# Altium footprint library CUSTOM PCB.PcbLib: 404 footprints (part 15 of 26)
Each footprint in its own frame and in the unit in brackets; x right, y up, seen from the top. Pads: shape width x height; smd on the part's side, far side on the other; paste and mask are expansions set on the pad; w line width, h text height; cw(c..) or ccw(c..) is an arc to the next point about the centre after c.
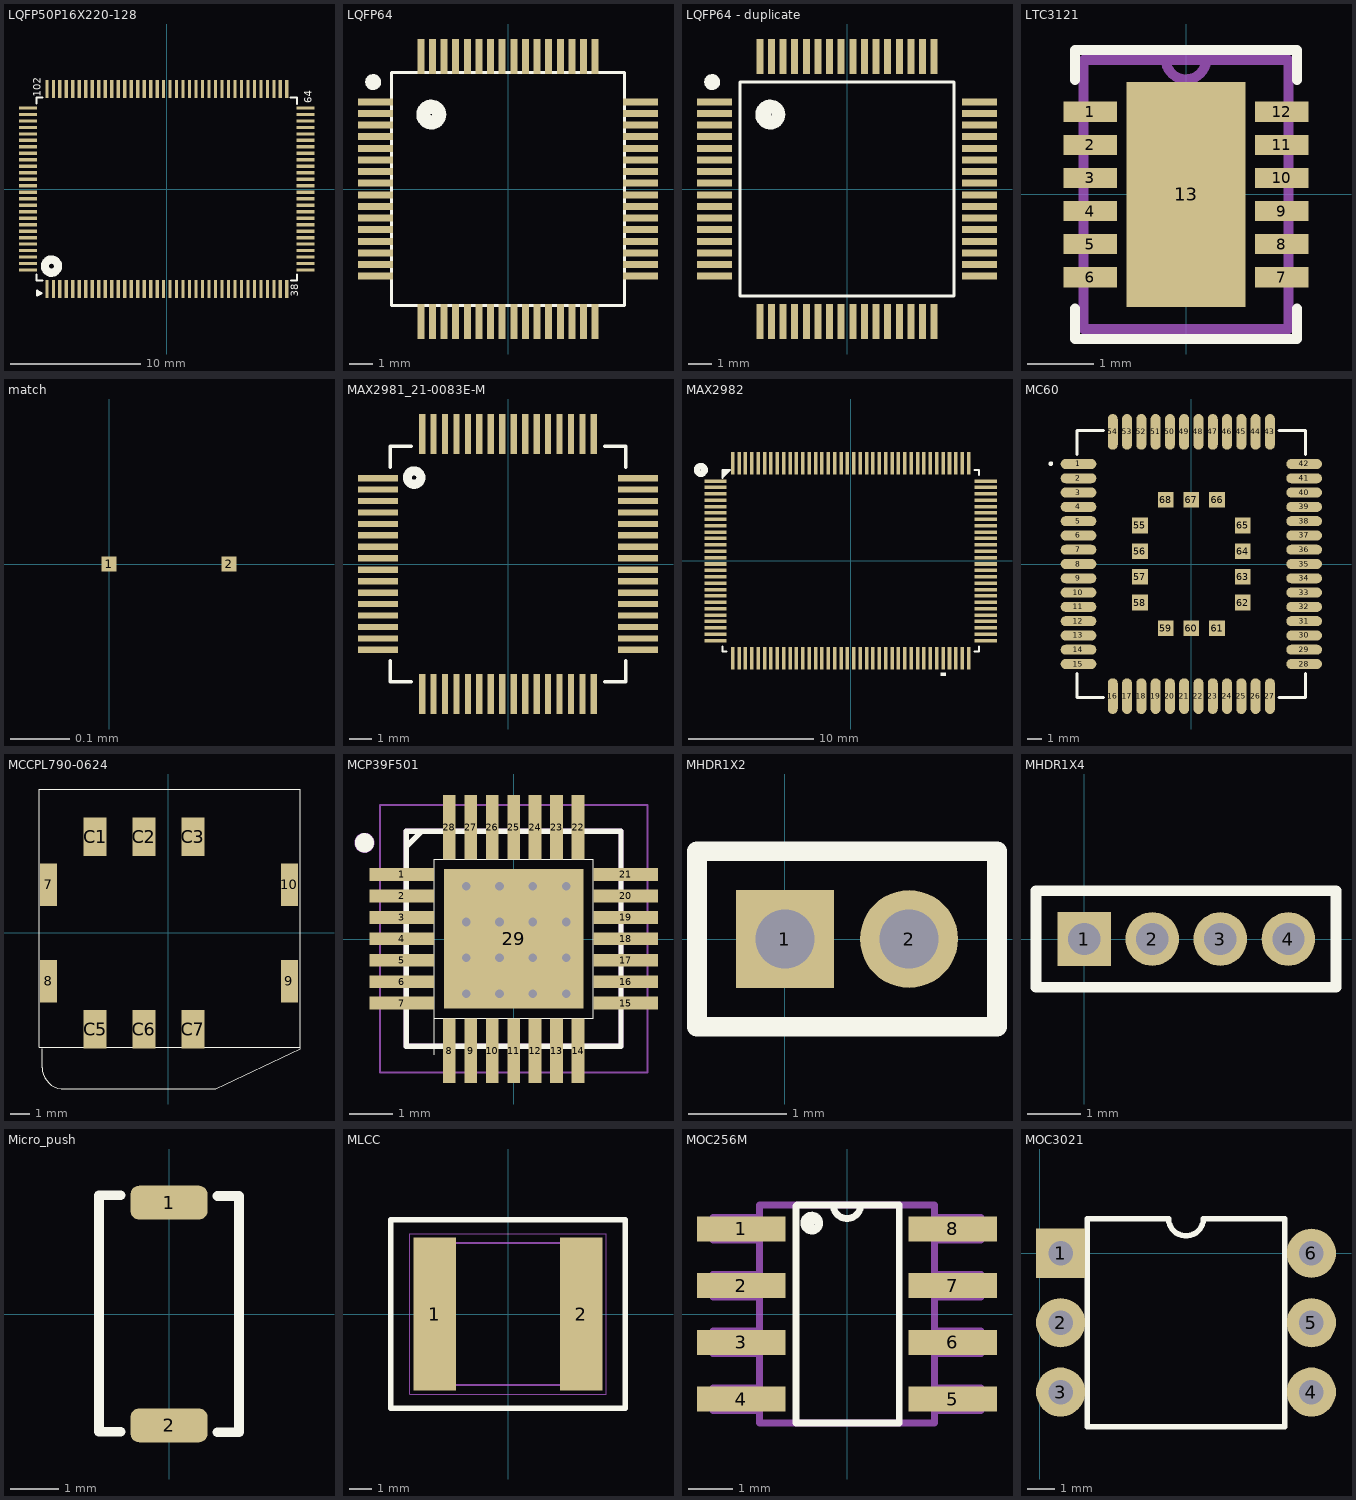
[diagram p14: the footprints below, top view; thin cyan lines are the x and y axes]

## LQFP50P16X220-128 [mm]
pads (128):
  rect 0.25x1.4 smd: 1(-9.25,-7.7) 2(-8.75,-7.7) 3(-8.25,-7.7) 4(-7.75,-7.7) 5(-7.25,-7.7) 6(-6.75,-7.7) 7(-6.25,-7.7) 8(-5.75,-7.7) 9(-5.25,-7.7) 10(-4.75,-7.7) 11(-4.25,-7.7) 12(-3.75,-7.7) 13(-3.25,-7.7) 14(-2.75,-7.7) 15(-2.25,-7.7) 16(-1.75,-7.7) 17(-1.25,-7.7) 18(-0.75,-7.7) 19(-0.25,-7.7) 20(0.25,-7.7) 21(0.75,-7.7) 22(1.25,-7.7) 23(1.75,-7.7) 24(2.25,-7.7) 25(2.75,-7.7) 26(3.25,-7.7) 27(3.75,-7.7) 28(4.25,-7.7) 29(4.75,-7.7) 30(5.25,-7.7) 31(5.75,-7.7) 32(6.25,-7.7) 33(6.75,-7.7) 34(7.25,-7.7) 35(7.75,-7.7) 36(8.25,-7.7) 37(8.75,-7.7) 38(9.25,-7.7) 65(9.25,7.7) 66(8.75,7.7) 67(8.25,7.7) 68(7.75,7.7) 69(7.25,7.7) 70(6.75,7.7) 71(6.25,7.7) 72(5.75,7.7) 73(5.25,7.7) 74(4.75,7.7) 75(4.25,7.7) 76(3.75,7.7) 77(3.25,7.7) 78(2.75,7.7) 79(2.25,7.7) 80(1.75,7.7) 81(1.25,7.7) 82(0.75,7.7) 83(0.25,7.7) 84(-0.25,7.7) 85(-0.75,7.7) 86(-1.25,7.7) 87(-1.75,7.7) 88(-2.25,7.7) 89(-2.75,7.7) 90(-3.25,7.7) 91(-3.75,7.7) 92(-4.25,7.7) 93(-4.75,7.7) 94(-5.25,7.7) 95(-5.75,7.7) 96(-6.25,7.7) 97(-6.75,7.7) 98(-7.25,7.7) 99(-7.75,7.7) 100(-8.25,7.7) 101(-8.75,7.7) 102(-9.25,7.7)
  rect 1.4x0.25 smd: 39(10.7,-6.25) 40(10.7,-5.75) 41(10.7,-5.25) 42(10.7,-4.75) 43(10.7,-4.25) 44(10.7,-3.75) 45(10.7,-3.25) 46(10.7,-2.75) 47(10.7,-2.25) 48(10.7,-1.75) 49(10.7,-1.25) 50(10.7,-0.75) 51(10.7,-0.25) 52(10.7,0.25) 53(10.7,0.75) 54(10.7,1.25) 55(10.7,1.75) 56(10.7,2.25) 57(10.7,2.75) 58(10.7,3.25) 59(10.7,3.75) 60(10.7,4.25) 61(10.7,4.75) 62(10.7,5.25) 63(10.7,5.75) 64(10.7,6.25) 103(-10.7,6.25) 104(-10.7,5.75) 105(-10.7,5.25) 106(-10.7,4.75) 107(-10.7,4.25) 108(-10.7,3.75) 109(-10.7,3.25) 110(-10.7,2.75) 111(-10.7,2.25) 112(-10.7,1.75) 113(-10.7,1.25) 114(-10.7,0.75) 115(-10.7,0.25) 116(-10.7,-0.25) 117(-10.7,-0.75) 118(-10.7,-1.25) 119(-10.7,-1.75) 120(-10.7,-2.25) 121(-10.7,-2.75) 122(-10.7,-3.25) 123(-10.7,-3.75) 124(-10.7,-4.25) 125(-10.7,-4.75) 126(-10.7,-5.25) 127(-10.7,-5.75) 128(-10.7,-6.25)
Top Overlay:
  circle w0.635: c-8.898,-5.944 r0.508
  lines w0.15: -10.05,-6.575 -10.05,-7.05 -9.6,-7.05 ; -10.05,6.575 -10.05,7.05 -9.6,7.05 ; 9.525,7.05 10.05,7.05 10.05,6.55 ; 9.575,-7.05 10.05,-7.05 10.05,-6.6
  lines w0.2: -9.996,-8.175 -9.996,-7.861 -9.686,-8.038 -9.983,-8.182
  text "38" at 10.132,-8.29 h0.55
  text "64" at 11.179,6.614 h0.55
  text "102" at -9.737,7.108 h0.55
3D body "User Library-LQFP-144-1.x_t": height 1.5, standoff -0.05, extent -10.981,-8.005 11.234,8.208

## LQFP64 [mm]
pads (64):
  rect 1.5x0.3 smd: 1(-5.7,3.75) 2(-5.7,3.25) 3(-5.7,2.75) 4(-5.7,2.25) 5(-5.7,1.75) 6(-5.7,1.25) 7(-5.7,0.75) 8(-5.7,0.25) 9(-5.7,-0.25) 10(-5.7,-0.75) 11(-5.7,-1.25) 12(-5.7,-1.75) 13(-5.7,-2.25) 14(-5.7,-2.75) 15(-5.7,-3.25) 16(-5.7,-3.75) 33(5.7,-3.75) 34(5.7,-3.25) 35(5.7,-2.75) 36(5.7,-2.25) 37(5.7,-1.75) 38(5.7,-1.25) 39(5.7,-0.75) 40(5.7,-0.25) 41(5.7,0.25) 42(5.7,0.75) 43(5.7,1.25) 44(5.7,1.75) 45(5.7,2.25) 46(5.7,2.75) 47(5.7,3.25) 48(5.7,3.75)
  rect 0.3x1.5 smd: 17(-3.75,-5.7) 18(-3.25,-5.7) 19(-2.75,-5.7) 20(-2.25,-5.7) 21(-1.75,-5.7) 22(-1.25,-5.7) 23(-0.75,-5.7) 24(-0.25,-5.7) 25(0.25,-5.7) 26(0.75,-5.7) 27(1.25,-5.7) 28(1.75,-5.7) 29(2.25,-5.7) 30(2.75,-5.7) 31(3.25,-5.7) 32(3.75,-5.7) 49(3.75,5.7) 50(3.25,5.7) 51(2.75,5.7) 52(2.25,5.7) 53(1.75,5.7) 54(1.25,5.7) 55(0.75,5.7) 56(0.25,5.7) 57(-0.25,5.7) 58(-0.75,5.7) 59(-1.25,5.7) 60(-1.75,5.7) 61(-2.25,5.7) 62(-2.75,5.7) 63(-3.25,5.7) 64(-3.75,5.7)
Top Overlay:
  circle w0.127: c-3.3,3.2 r0.583
  circle w0.127: c-3.3,3.2 r0.566
  circle w0.127: c-3.3,3.2 r0.5
  circle w0.127: c-3.3,3.2 r0.424
  circle w0.127: c-3.3,3.2 r0.283
  circle w0.127: c-3.3,3.2 r0.361
  circle w0.127: c-3.3,3.2 r0.141
  circle w0.127: c-3.3,3.2 r0.224
  circle w0.127: c-3.3,3.2 r0.1
  circle w0.127: c-5.8,4.6 r0.283
  circle w0.127: c-5.8,4.6 r0.224
  circle w0.127: c-5.8,4.6 r0.141
  circle w0.127: c-5.8,4.6 r0.1
  circle w0.127: c-5.8,4.6 r0.141
  circle w0.127: c-5.9,4.6 r0.1
  lines w0.127: -5,-5 5,-5 5,5 -5,5 -5,-5
3D body "STM32F446RET6--3DModel-STEP-56544.STEP": height 1.63, standoff 0.03, extent -6,-6 6,6

## LQFP64 - duplicate [mm]
pads (64):
  rect 1.5x0.3 smd: 1(-5.7,3.75) 2(-5.7,3.25) 3(-5.7,2.75) 4(-5.7,2.25) 5(-5.7,1.75) 6(-5.7,1.25) 7(-5.7,0.75) 8(-5.7,0.25) 9(-5.7,-0.25) 10(-5.7,-0.75) 11(-5.7,-1.25) 12(-5.7,-1.75) 13(-5.7,-2.25) 14(-5.7,-2.75) 15(-5.7,-3.25) 16(-5.7,-3.75) 33(5.7,-3.75) 34(5.7,-3.25) 35(5.7,-2.75) 36(5.7,-2.25) 37(5.7,-1.75) 38(5.7,-1.25) 39(5.7,-0.75) 40(5.7,-0.25) 41(5.7,0.25) 42(5.7,0.75) 43(5.7,1.25) 44(5.7,1.75) 45(5.7,2.25) 46(5.7,2.75) 47(5.7,3.25) 48(5.7,3.75)
  rect 0.3x1.5 smd: 17(-3.75,-5.7) 18(-3.25,-5.7) 19(-2.75,-5.7) 20(-2.25,-5.7) 21(-1.75,-5.7) 22(-1.25,-5.7) 23(-0.75,-5.7) 24(-0.25,-5.7) 25(0.25,-5.7) 26(0.75,-5.7) 27(1.25,-5.7) 28(1.75,-5.7) 29(2.25,-5.7) 30(2.75,-5.7) 31(3.25,-5.7) 32(3.75,-5.7) 49(3.75,5.7) 50(3.25,5.7) 51(2.75,5.7) 52(2.25,5.7) 53(1.75,5.7) 54(1.25,5.7) 55(0.75,5.7) 56(0.25,5.7) 57(-0.25,5.7) 58(-0.75,5.7) 59(-1.25,5.7) 60(-1.75,5.7) 61(-2.25,5.7) 62(-2.75,5.7) 63(-3.25,5.7) 64(-3.75,5.7)
Top Overlay:
  circle w0.127: c-5.9,4.6 r0.1
  circle w0.127: c-5.8,4.6 r0.141
  circle w0.127: c-5.8,4.6 r0.1
  circle w0.127: c-5.8,4.6 r0.141
  circle w0.127: c-5.8,4.6 r0.224
  circle w0.127: c-5.8,4.6 r0.283
  circle w0.127: c-3.4,3.2 r0.1
  circle w0.127: c-3.3,3.2 r0.224
  circle w0.127: c-3.3,3.2 r0.141
  circle w0.127: c-3.3,3.2 r0.361
  circle w0.127: c-3.3,3.2 r0.283
  circle w0.127: c-3.3,3.2 r0.424
  circle w0.127: c-3.3,3.2 r0.5
  circle w0.127: c-3.3,3.2 r0.566
  circle w0.127: c-3.3,3.2 r0.583
  lines w0.127: -4.6,-4.6 -4.6,4.6 4.6,4.6 4.6,-4.6 -4.6,-4.6
3D body "STM32F446RET6--3DModel-STEP-56544.STEP": height 1.63, standoff 0.03, extent -6,-6 6,6

## LTC3121 [mil]
pads (13):
  rect 32x12 smd: 1(-57,49.21) 2(-57,29.53) 3(-57,9.84) 4(-57,-9.84) 5(-57,-29.53) 6(-57,-49.21) 7(57,-49.21) 8(57,-29.53) 9(57,-9.84) 10(57,9.84) 11(57,29.53) 12(57,49.21)
  rect 71x134 smd: 13(0,0)
Top Overlay:
  lines w6: -66,-68 -66,-86 66,-86 66,-68 ; -66,68 -66,86 66,86 66,68
Top Paste:
  region: -31.56,63.06 -31.56,3.94 31.56,3.94 31.56,63.06
  region: -31.56,-3.94 -31.56,-63.06 31.56,-63.06 31.56,-3.94
Mechanical 4:
  lines w6: -61,-80 61,-80 ; -61,-80 -61,80 ; -61,-80 61,-80 ; -61,-80 -61,80 ; -61,80 -12,80 ; -61,80 -12,80 ; -12,80 61,80 ; -12,80 61,80 ; 61,-80 61,80 ; 61,-80 61,80 ; -12,80.08 ccw(c0,80.5) 12,80.92 cw(c0,80.5) -12,80.08

## match [mil]
pads (2):
  rect 1x1 smd: 1(0,0) 2(8,0)

## MAX2981_21-0083E-M [mil]
pads (64):
  rect 70x11 smd paste+0 mask+0: 1(-227,150) 2(-227,130) 3(-227,110) 4(-227,90) 5(-227,70) 6(-227,50) 7(-227,30) 8(-227,10) 9(-227,-10) 10(-227,-30) 11(-227,-50) 12(-227,-70) 13(-227,-90) 14(-227,-110) 15(-227,-130) 16(-227,-150) 33(227,-150) 34(227,-130) 35(227,-110) 36(227,-90) 37(227,-70) 38(227,-50) 39(227,-30) 40(227,-10) 41(227,10) 42(227,30) 43(227,50) 44(227,70) 45(227,90) 46(227,110) 47(227,130) 48(227,150)
  rect 11x70 smd paste+0 mask+0: 17(-150,-227) 18(-130,-227) 19(-110,-227) 20(-90,-227) 21(-70,-227) 22(-50,-227) 23(-30,-227) 24(-10,-227) 25(10,-227) 26(30,-227) 27(50,-227) 28(70,-227) 29(90,-227) 30(110,-227) 31(130,-227) 32(150,-227) 49(150,227) 50(130,227) 51(110,227) 52(90,227) 53(70,227) 54(50,227) 55(30,227) 56(10,227) 57(-10,227) 58(-30,227) 59(-50,227) 60(-70,227) 61(-90,227) 62(-110,227) 63(-130,227) 64(-150,227)
Top Overlay:
  circle w15.75: c-164,151 r11.81
  lines w6: -206,-168.6 -206,-206 -168.6,-206 ; -206,168.6 -206,206 -168.6,206 ; 168.6,-206 206,-206 206,-168.6 ; 168.6,206 206,206 206,168.6
3D body "21-0083E-M.step": height 63.11, standoff 0, extent -240,-240 240,240

## MAX2982 [mil]
pads (128):
  rect 70x11 smd paste+0 mask+0: 1(-424,250) 2(-424,230) 3(-424,210) 4(-424,190) 5(-424,170) 6(-424,150) 7(-424,130) 8(-424,110) 9(-424,90) 10(-424,70) 11(-424,50) 12(-424,30) 13(-424,10) 14(-424,-10) 15(-424,-30) 16(-424,-50) 17(-424,-70) 18(-424,-90) 19(-424,-110) 20(-424,-130) 21(-424,-150) 22(-424,-170) 23(-424,-190) 24(-424,-210) 25(-424,-230) 26(-424,-250) 65(424,-250) 66(424,-230) 67(424,-210) 68(424,-190) 69(424,-170) 70(424,-150) 71(424,-130) 72(424,-110) 73(424,-90) 74(424,-70) 75(424,-50) 76(424,-30) 77(424,-10) 78(424,10) 79(424,30) 80(424,50) 81(424,70) 82(424,90) 83(424,110) 84(424,130) 85(424,150) 86(424,170) 87(424,190) 88(424,210) 89(424,230) 90(424,250)
  rect 11x70 smd paste+0 mask+0: 27(-370,-306) 28(-350,-306) 29(-330,-306) 30(-310,-306) 31(-290,-306) 32(-270,-306) 33(-250,-306) 34(-230,-306) 35(-210,-306) 36(-190,-306) 37(-170,-306) 38(-150,-306) 39(-130,-306) 40(-110,-306) 41(-90,-306) 42(-70,-306) 43(-50,-306) 44(-30,-306) 45(-10,-306) 46(10,-306) 47(30,-306) 48(50,-306) 49(70,-306) 50(90,-306) 51(110,-306) 52(130,-306) 53(150,-306) 54(170,-306) 55(190,-306) 56(210,-306) 57(230,-306) 58(250,-306) 59(270,-306) 60(290,-306) 61(310,-306) 62(330,-306) 63(350,-306) 64(370,-306) 91(370,306) 92(350,306) 93(330,306) 94(310,306) 95(290,306) 96(270,306) 97(250,306) 98(230,306) 99(210,306) 100(190,306) 101(170,306) 102(150,306) 103(130,306) 104(110,306) 105(90,306) 106(70,306) 107(50,306) 108(30,306) 109(10,306) 110(-10,306) 111(-30,306) 112(-50,306) 113(-70,306) 114(-90,306) 115(-110,306) 116(-130,306) 117(-150,306) 118(-170,306) 119(-190,306) 120(-210,306) 121(-230,306) 122(-250,306) 123(-270,306) 124(-290,306) 125(-310,306) 126(-330,306) 127(-350,306) 128(-370,306)
Top Overlay:
  circle w20: c-470,285 r12
  region: 297.5,-351 282.5,-351 282.5,-361 297.5,-361
  lines w6: -402.5,-268.6 -402.5,-284.5 -388.6,-284.5 ; -402,273 -379,284.5 ; -393,276.74 -402.5,284.5 ; 388.6,-284.5 402.5,-284.5 402.5,-268.6 ; 388.6,284.5 402.5,284.5 402.5,268.6 ; -402.5,260 -388.6,284.5 ; -402.5,260 -379,284.5 ; -402.5,260 -402.5,284.5 ; -402.5,284.5 -388.6,284.5 ; -402.5,284.5 -388.6,284.5 ; -388.6,284.5 -379,284.5
3D body: height 10, standoff 0, extent 0,0 10,10
3D body "21-0086D.step": height 63.11, standoff 0, extent -437.01,-319.01 437.01,319.01

## MC60 [mm]
pads (68):
  oval 2.5x0.7 smd: 1(-7.9,7) 2(-7.9,6) 3(-7.9,5) 4(-7.9,4) 5(-7.9,3) 6(-7.9,2) 7(-7.9,1) 8(-7.9,0) 9(-7.9,-1) 10(-7.9,-2) 11(-7.9,-3) 12(-7.9,-4) 13(-7.9,-5) 14(-7.9,-6) 15(-7.9,-7) 28(7.9,-7) 29(7.9,-6) 30(7.9,-5) 31(7.9,-4) 32(7.9,-3) 33(7.9,-2) 34(7.9,-1) 35(7.9,0) 36(7.9,1) 37(7.9,2) 38(7.9,3) 39(7.9,4) 40(7.9,5) 41(7.9,6) 42(7.9,7)
  oval 0.7x2.5 smd: 16(-5.5,-9.25) 17(-4.5,-9.25) 18(-3.5,-9.25) 19(-2.5,-9.25) 20(-1.5,-9.25) 21(-0.5,-9.25) 22(0.5,-9.25) 23(1.5,-9.25) 24(2.5,-9.25) 25(3.5,-9.25) 26(4.5,-9.25) 27(5.5,-9.25) 43(5.5,9.25) 44(4.5,9.25) 45(3.5,9.25) 46(2.5,9.25) 47(1.5,9.25) 48(0.5,9.25) 49(-0.5,9.25) 50(-1.5,9.25) 51(-2.5,9.25) 52(-3.5,9.25) 53(-4.5,9.25) 54(-5.5,9.25)
  rect 1.1x1.1 smd: 55(-3.6,2.7) 56(-3.6,0.9) 57(-3.6,-0.9) 58(-3.6,-2.7) 59(-1.8,-4.5) 60(0,-4.5) 61(1.8,-4.5) 62(3.6,-2.7) 63(3.6,-0.9) 64(3.6,0.9) 65(3.6,2.7) 66(1.8,4.5) 67(0,4.5) 68(-1.8,4.5)
Top Overlay:
  circle w0.2: c-9.835,7.021 r0.062
  lines w0.2: -8,-7.658 -8,-9.35 -6.143,-9.35 ; -8,7.658 -8,9.35 -6.143,9.35 ; 6.143,-9.35 8,-9.35 8,-7.658 ; 6.143,9.35 8,9.35 8,7.658
3D body "User Library-Quectel MC60.x_t": height 2.1, standoff 0, extent -8.001,-9.351 8.001,9.351

## MCCPL790-0624 [mm]
pads (10):
  rect 0.9x2.2 smd: 7(-6.22,2.5) 8(-6.22,-2.5) 9(6.28,-2.5) 10(6.28,2.5)
  rect 1.2x2 smd: C1(-3.81,5) C2(-1.27,5) C3(1.27,5) C5(-3.81,-5) C6(-1.27,-5) C7(1.27,-5)
Top Overlay:
  lines w0.05: -6.559,-6 -6.559,-6.996 ccw(c-5.426,-6.966) -5.396,-8.1 2.452,-8.1 6.841,-6 ; 6.841,-5.998 6.841,-3.727 6.841,3.734 6.841,7.468 3.437,7.468 -6.7,7.468 -6.7,3.734 -6.7,0 -6.7,-5.94 0,-5.94 6.841,-5.94

## MCP39F501 [mm] "Power Management Specialised - PMIC Single-Phase Power-Monitoring IC"
pads (29):
  rect 1.5x0.3 smd: 1(-2.61,1.505) 2(-2.61,1.005) 3(-2.61,0.505) 4(-2.61,0.005) 5(-2.61,-0.495) 6(-2.61,-0.995) 7(-2.61,-1.495) 15(2.61,-1.495) 16(2.61,-0.995) 17(2.61,-0.495) 18(2.61,0.005) 19(2.61,0.505) 20(2.61,1.005) 21(2.61,1.505)
  rect 0.3x1.5 smd: 8(-1.501,-2.605) 9(-1.001,-2.605) 10(-0.501,-2.605) 11(-0.001,-2.605) 12(0.499,-2.605) 13(0.999,-2.605) 14(1.499,-2.605) 22(1.499,2.605) 23(0.999,2.605) 24(0.499,2.605) 25(-0.001,2.605) 26(-0.501,2.605) 27(-1.001,2.605) 28(-1.501,2.605)
  rect 3.25x3.25 smd: 29(-0.001,0.005)
via -1.108,-1.278 diameter 0.5 hole 0.2
via -0.332,-1.278 diameter 0.5 hole 0.2
via 0.444,-1.278 diameter 0.5 hole 0.2
via 1.22,-1.278 diameter 0.5 hole 0.2
via -1.108,-0.442 diameter 0.5 hole 0.2
via -0.332,-0.442 diameter 0.5 hole 0.2
via 0.444,-0.442 diameter 0.5 hole 0.2
via 1.22,-0.442 diameter 0.5 hole 0.2
via -1.108,0.395 diameter 0.5 hole 0.2
via -0.332,0.395 diameter 0.5 hole 0.2
via 0.444,0.395 diameter 0.5 hole 0.2
via 1.22,0.395 diameter 0.5 hole 0.2
via 1.22,1.232 diameter 0.5 hole 0.2
via 0.444,1.232 diameter 0.5 hole 0.2
via -0.332,1.232 diameter 0.5 hole 0.2
via -1.108,1.232 diameter 0.5 hole 0.2
Top Overlay:
  circle w0.1: c-3.478,2.24 r0.047
  circle w0.15: c-3.478,2.24 r0.15
  lines w0.001: -1.856,-2.692 -1.856,1.643 -1.856,1.859 1.634,1.859 1.853,1.859 1.853,-1.631 1.853,-1.849 -1.856,-1.849
  lines w0.127: -2.501,-2.145 -2.501,-2.495 ; -2.151,-2.495 -2.501,-2.495 ; 2.149,-2.495 2.499,-2.495 ; 2.499,2.155 2.499,2.505 ; -2.501,-2.495 2.499,-2.495 ; -2.501,-2.495 -2.501,2.155 ; -2.501,2.155 -2.151,2.505 ; -2.501,2.155 -2.501,2.505 -2.151,2.505 ; -2.151,2.505 2.149,2.505 ; 2.149,2.505 2.499,2.505 ; 2.149,2.505 2.499,2.505 ; 2.499,-2.495 2.499,-2.145 ; 2.499,-2.495 2.499,-2.145 ; 2.499,-2.145 2.499,2.505
Top Paste:
  region: 0.209,1.415 1.409,1.415 1.409,0.215 0.209,0.215
  region: -1.411,1.415 -0.211,1.415 -0.211,0.215 -1.411,0.215
  region: -1.411,-0.205 -0.211,-0.205 -0.211,-1.405 -1.411,-1.405
  region: 0.209,-0.205 1.409,-0.205 1.409,-1.405 0.209,-1.405
Mechanical 1:
  lines w0.05: -3.116,-3.11 -3.116,3.12 3.114,3.12 3.114,-3.11 -3.116,-3.11
Mechanical 4:
  circle w0.17: c-3.478,2.24 r0.15
  circle w0.17: c-3.478,2.24 r0.15
  lines w0.127: -2.501,-2.495 2.499,-2.495 ; -2.501,-2.495 -2.501,2.505 ; -2.501,-2.495 2.499,-2.495 ; -2.501,-2.495 -2.501,2.505 ; -2.501,2.505 2.499,2.505 ; -2.501,2.505 2.499,2.505 ; 2.499,-2.495 2.499,2.505 ; 2.499,-2.495 2.499,2.505
3D body "User Library-QFN28-0_5.STEP": height 1, standoff 0, extent -2.465,-2.467 2.535,2.533

## MHDR1X2 [mm] "Connector; Header; 2 Position, 0.6D"
pads (2):
  rect 1x1 hole 0.6: 1(0,0)
  round 1 hole 0.6: 2(1.27,0)
Top Overlay:
  lines w0.2: -0.9,-0.9 2.17,-0.9 2.17,0.9 -0.9,0.9 -0.9,-0.9

## MHDR1X4 [mm] "Connector; Header; 4 Position, 0.6D"
height 11.3
pads (4):
  rect 1x1 hole 0.6: 1(0,0)
  round 1 hole 0.6: 2(1.27,0) 3(2.54,0) 4(3.81,0)
Top Overlay:
  lines w0.2: -0.9,-0.9 -0.9,0.9 4.7,0.9 4.7,-0.9 -0.9,-0.9

## Micro_push [mm]
pads (2):
  rrect50% 1.6x0.7 smd: 1(0,2.311) 2(0,-2.311)
Top Overlay:
  lines w0.2: -1.003,2.465 -1.452,2.465 -1.452,-2.446 -1,-2.446 ; 1.003,-2.45 1.45,-2.45 1.45,2.449 1.004,2.449
3D body "User Library-Pushbutton3x4x2.STEP": height 1.95, standoff -0.05, extent -1.45,-2.45 1.45,2.45

## MLCC [mm]
pads (2):
  rect 1.89x6.81 smd: 1(-3.26,0) 2(3.26,0)
Top Overlay:
  lines w0.254: -5.207,-4.191 5.207,-4.191 5.207,4.191 -5.207,4.191 -5.207,-4.191
Mechanical 15:
  lines w0.1: -3.75,-3.15 3.75,-3.15 3.75,3.15 -3.75,3.15 -3.75,-3.15
Mechanical 20:
  lines w0.05: -4.355,-3.56 4.355,-3.56 4.355,3.56 -4.355,3.56 -4.355,-3.56
3D body "KTS501B125M76N0T00.stp": height 3.5, standoff 0, extent -3.75,-3.15 3.75,3.15
3D body "KTS501B125M76N0T00.stp": height 6.93, standoff 3.43, extent -3.75,-3.15 3.75,3.15

## MOC256M [mil] "AC Opto Isolator"
pads (8):
  rect 78x22 smd: 1(-93,75) 2(-93,25) 3(-93,-25) 4(-93,-75) 5(93,-75) 6(93,-25) 7(93,25) 8(93,75)
Top Overlay:
  circle w3.94: c-31,80 r1
  circle w3.94: c-31,80 r5
  circle w3.94: c-31,80 r8.06
  lines w6: -12,96 ccw(c0,96) 12,96 ; -12,96 -44,96 -45,95 -45,-96 46,-96 46,96 12,96 ; -12,96 12,96
Mechanical 1:
  lines w0: -12,96 ccw(c0,96) 12,96
  lines w6: -118,-85 -118,-65 -77,-65 -77,-85 -118,-85 ; -118,-35 -118,-15 -77,-15 -77,-35 -118,-35 ; -118,15 -118,35 -77,35 -77,15 -118,15 ; -118,65 -118,85 -77,85 -77,65 -118,65 ; -77,-96 77,-96 77,96 12,96 -12,96 -77,96 -77,-96 ; 77,-85 77,-65 118,-65 118,-85 77,-85 ; 77,-35 77,-15 118,-15 118,-35 77,-35 ; 77,15 77,35 118,35 118,15 77,15 ; 77,65 77,85 118,85 118,65 77,65
3D body "User Library-SOIC-8-1.SLDPRT": height 68.9, standoff 0, extent -116.1,-96.46 120.11,96.46

## MOC3021 [mm]
pads (6):
  rect 1.8x1.8 hole 0.9: 1(0.762,0)
  round 1.8 hole 0.9: 2(0.762,-2.54) 3(0.762,-5.08) 4(9.938,-5.08) 5(9.938,-2.54) 6(9.938,0)
Top Overlay:
  lines w0.2: 1.735,-6.35 8.965,-6.35 8.965,1.27 5.985,1.27 cw(c5.35,1.27) 4.715,1.27 1.735,1.27 1.735,-6.35
3D body "User Library-Optoacoplador_MOC3020.STEP": height 3.06, standoff -4.62, extent -0.044,-7.112 10.713,1.778